# Altium footprint library DrPCB.PcbLib: 910 footprints (part 27 of 57)
Each footprint in its own frame and in the unit in brackets; x right, y up, seen from the top. Pads: shape width x height; smd on the part's side, far side on the other; paste and mask are expansions set on the pad; w line width, h text height; cw(c..) or ccw(c..) is an arc to the next point about the centre after c.
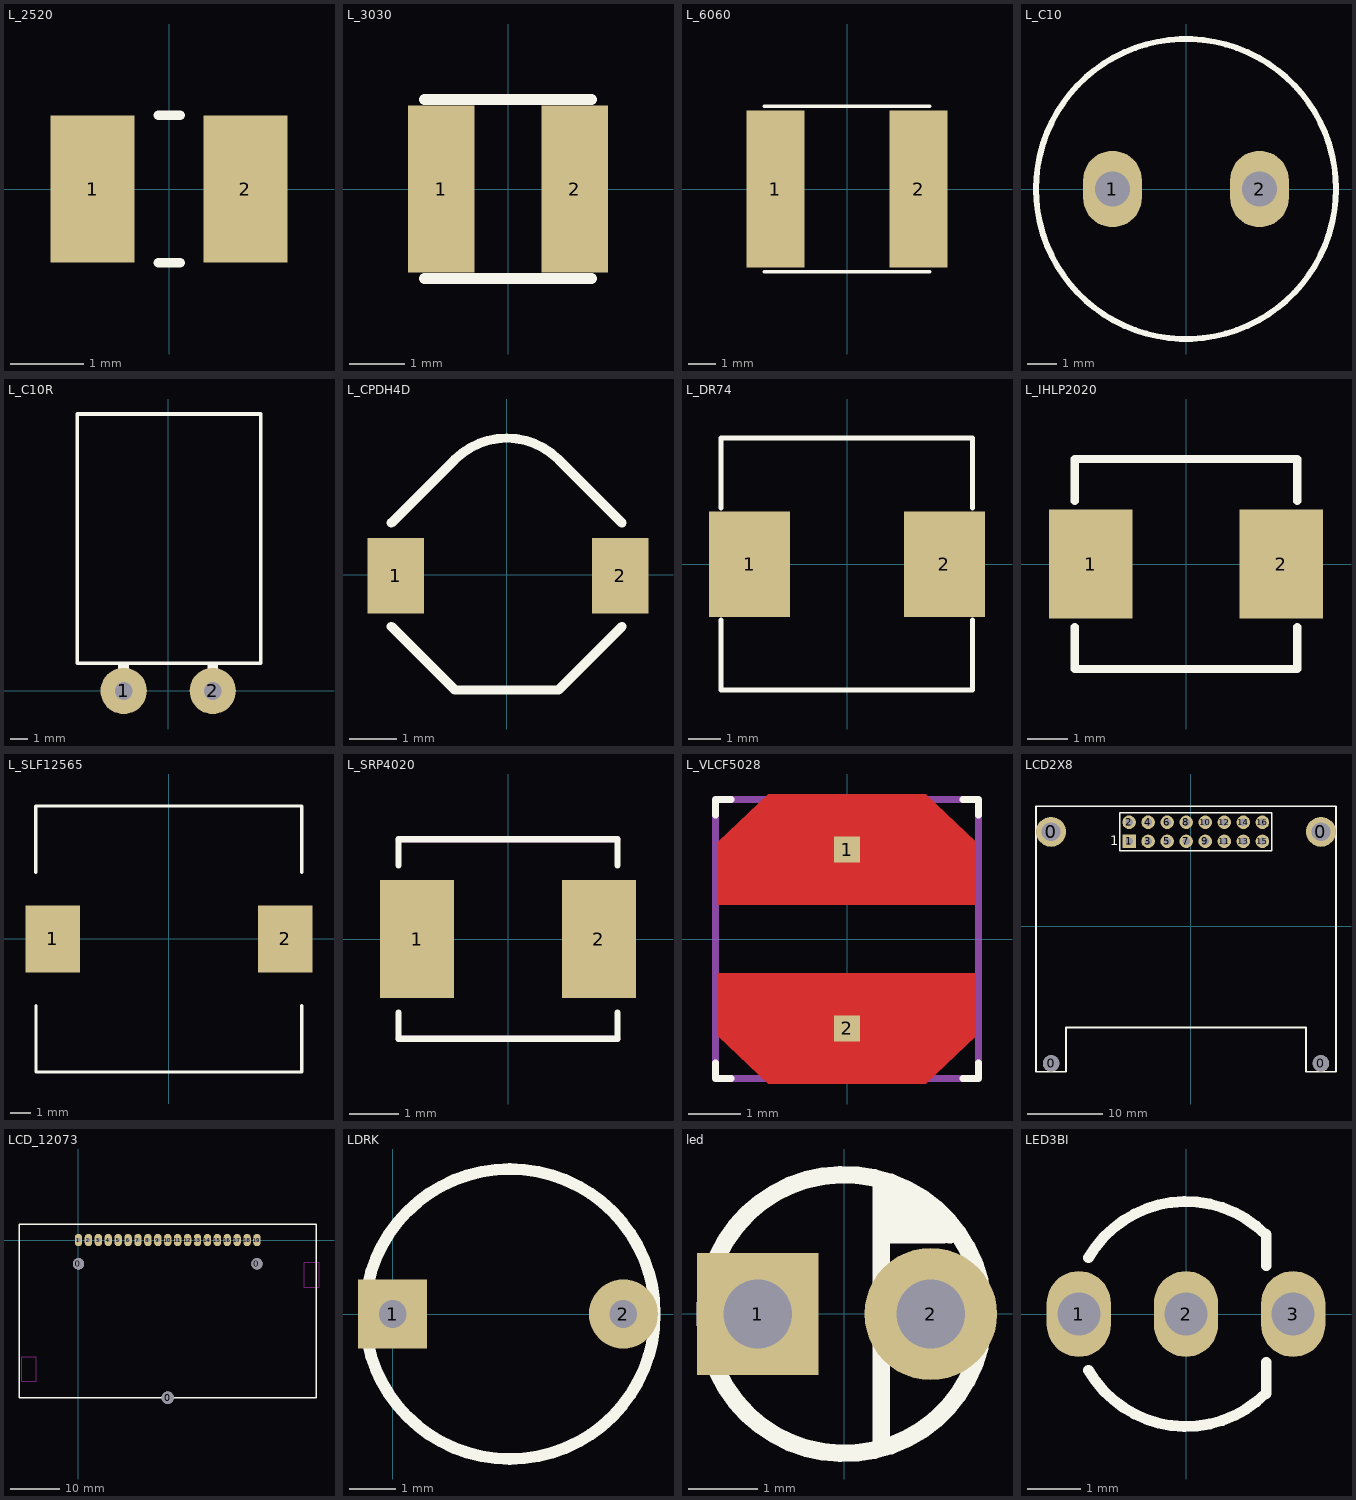
[diagram p26: the footprints below, top view; thin cyan lines are the x and y axes]

## L_2520 [mm]
pads (2):
  rect 1.14x2 smd: 1(-1.04,0) 2(1.04,0)
Top Overlay:
  lines w0.127: -0.148,-1.003 0.152,-1.003 ; -0.148,1.003 0.152,1.003
3D body "DFE252010F-2R2M=P2.STEP": height 1, standoff 0, extent -1.25,-1 1.25,1

## L_3030 [mm]
pads (2):
  rect 1.2x3 smd paste+0 mask+0: 1(-1.2,0) 2(1.2,0)
Top Overlay:
  lines w0.2: -1.501,-1.613 1.499,-1.613 ; -1.501,1.613 1.499,1.613
3D body "LQH3NPN100MG0L.STEP": height 1, standoff 0, extent -1.5,-1.5 1.5,1.5

## L_6060 [mm]
pads (2):
  rect 2.1x5.7 smd: 1(-2.6,0) 2(2.6,0)
Top Overlay:
  lines w0.127: -3,-3 3,-3 ; -3,3 3,3
3D body "1255AY-100M=P3.STEP": height 4.5, standoff 0, extent -3,-3 3,3

## L_C10 [mm] "INDUCTOR, Cylinder, 10mm,"
pads (2):
  oval 2x2.6 hole 1.2: 1(-2.5,0) 2(2.5,0)
Top Overlay:
  circle w0.2: c0,0 r5.1
3D body "User Library-Inductor 10x12 (200 mils).STEP": height 12.13, standoff -3.87, extent -5,-5 5,5

## L_C10R [mm] "INDUCTOR, Cylinder, 10mm,"
pads (2):
  round 2.6 hole 1: 1(-2.5,0) 2(2.5,0)
Top Overlay:
  rectangle: -2.805,1.143 -2.205,1.543
  region: 2.795,1.543 2.195,1.543 2.195,1.143 2.795,1.143
  lines w0.2: -5.105,1.543 5.195,1.543 5.195,15.543 -5.105,15.543 -5.105,1.543

## L_CPDH4D [mm]
pads (2):
  rect 1.2x1.6 smd paste+0 mask+0: 1(-2.348,-0.022) 2(2.402,-0.022)
Top Overlay:
  lines w0.2: -2.44,-1.096 -1.096,-2.44 1.096,-2.44 2.44,-1.096 ; -2.44,1.096 -1.096,2.44 cw(c0,1.344) 1.096,2.44 2.44,1.096
3D body: height 0.25, standoff 0, extent 0.027,-0.022 0.281,0.232
3D body "User Library-Sumida_CDPH4D19FNP-6R8MC.step": height 1.9, standoff -0.03, extent -3.465,-3.465 3.465,3.465

## L_DR74 [mm]
pads (2):
  rect 2.5x3.25 smd: 1(-3,0) 2(3,0)
Top Overlay:
  lines w0.15: -3.886,-1.725 -3.886,-3.873 3.873,-3.873 3.873,-1.725 ; -3.886,1.725 -3.886,3.886 3.873,3.886 3.873,1.725
3D body "DR74-2R2-R--3DModel-STEP-56544.STEP": height 4.35, standoff 0, extent -3.8,-3.8 3.8,3.8

## L_IHLP2020 [mm]
pads (2):
  rect 2.05x2.7 smd paste-0.3: 1(-2.35,0) 2(2.35,0)
Top Overlay:
  lines w0.2: -2.745,-1.549 -2.745,-2.59 2.745,-2.59 2.745,-1.549 ; -2.745,1.549 -2.745,2.59 2.745,2.59 2.745,1.549
3D body "ihlp2020bzer100m11.stp": height 1.93, standoff 0.01, extent -2.725,-2.573 2.725,2.573

## L_SLF12565 [mm]
pads (2):
  rect 2.6x3.2 smd: 1(-5.55,0) 2(5.55,0)
Top Overlay:
  lines w0.15: -6.35,3.175 -6.35,6.337 6.325,6.337 6.325,3.175 ; -6.337,-3.175 -6.337,-6.337 6.325,-6.337 6.325,-3.175
3D body "SLF12565T-100M4R8-H.STEP": height 6.85, standoff 0, extent -6.25,-6.25 6.25,6.25

## L_SRP4020 [mm]
pads (2):
  rect 1.5x2.4 smd: 1(-1.85,0) 2(1.85,0)
Top Overlay:
  lines w0.127: -2.225,-1.5 -2.225,-2.03 2.225,-2.03 2.225,-1.5 ; -2.225,1.5 -2.225,2.03 2.225,2.03 2.225,1.5
Mechanical 13:
  lines w0.127: -2.225,-2.03 2.225,-2.03 ; -2.225,2.03 2.225,2.03
3D body "SRP4020TA-R10Y.STEP": height 2, standoff 0, extent -2.225,-2.03 2.225,2.03

## L_VLCF5028 [mm]
height 2
pads (2):
  rect 0.5x0.5 smd paste-1 mask+0: 1(0,1.7) 2(0,-1.7)
Top Layer:
  region: 2.45,-1.85 1.5,-2.75 -1.5,-2.75 -2.45,-1.85 -2.45,-0.65 2.45,-0.65
  region: 2.45,1.85 2.45,0.65 -2.45,0.65 -2.45,1.85 -1.5,2.75 1.5,2.75
Top Overlay:
  lines w0.127: -2.5,-2.35 -2.5,-2.65 -2.2,-2.65 ; -2.5,2.35 -2.5,2.65 -2.2,2.65 ; 2.2,-2.65 2.5,-2.65 2.5,-2.35 ; 2.2,2.65 2.5,2.65 2.5,2.35
Top Paste:
  region: 2.45,-1.85 1.5,-2.75 -1.5,-2.75 -2.45,-1.85 -2.45,-0.65 2.45,-0.65
  region: 2.45,1.85 2.45,0.65 -2.45,0.65 -2.45,1.85 -1.5,2.75 1.5,2.75
Top Solder:
  region: 2.55,-1.95 1.6,-2.85 -1.6,-2.85 -2.55,-1.95 -2.55,-0.55 2.55,-0.55
  region: 2.55,1.95 2.55,0.55 -2.55,0.55 -2.55,1.95 -1.6,2.85 1.6,2.85
Mechanical 13:
  lines w0.127: -2.5,-2.65 2.5,-2.65 2.5,2.65 -2.5,2.65 -2.5,-2.65
3D body "VLCF5028T-1R3N2R5-2.STEP": height 2.8, standoff 0, extent -2.5,-2.5 2.5,2.5

## LCD2X8 [mm]
pads (20):
  round 2.2 hole 2.2: 0(-18.612,-18.275) 0(17.38,-18.275)
  round 4 hole 2.5: 0(-18.612,12.611) 0(17.38,12.611)
  rect 1.8x1.8 hole 1: 1(-8.211,11.341)
  round 1.8 hole 1: 2(-8.211,13.881) 3(-5.671,11.341) 4(-5.671,13.881) 5(-3.131,11.341) 6(-3.131,13.881) 7(-0.591,11.341) 8(-0.591,13.881) 9(1.949,11.341) 10(1.949,13.881) 11(4.489,11.341) 12(4.489,13.881) 13(7.029,11.341) 14(7.029,13.881) 15(9.569,11.341) 16(9.569,13.881)
Top Overlay:
  lines w0.2: -9.481,10.071 10.839,10.071 10.839,15.151 -9.481,15.151 -9.481,10.071
  lines w0.254: -20.618,-19.38 -16.618,-19.38 -16.618,-13.487 15.382,-13.487 15.382,-19.38 19.382,-19.38 19.382,16.015 -20.618,16.015 -20.618,-19.38
  text "1" at -10.751,10.833 h1.27

## LCD_12073 [mm]
pads (22):
  round 2.3 hole 2.3: 0(0,-4.8) 0(36,-4.8)
  round 2.5 hole 2.5: 0(18,-31.792)
  oval 1.5x2.5 hole 0.8: 1(0,0) 2(2,0) 3(4,0) 4(6,0) 5(8,0) 6(10,0) 7(12,0) 8(14,0) 9(16,0) 10(18,0) 11(20,0) 12(22,0) 13(24,0) 14(26,0) 15(28,0) 16(30,0) 17(32,0) 18(34,0) 19(36,0)
Top Overlay:
  lines w0.3: -12,-31.792 48,-31.792 48,3.208 -12,3.208 -12,-31.792
Keep-Out Layer:
  lines w0.1: -11.493,-28.466 -11.493,-23.5 -8.509,-23.5 -8.509,-28.466 -11.493,-28.466 ; 45.504,-9.5 45.504,-4.508 48.489,-4.508 48.514,-4.534 48.514,-9.5 45.504,-9.5

## LDRK [mm]
pads (2):
  rect 1.5x1.5 hole 0.6: 1(0,0)
  round 1.5 hole 0.6: 2(5,0)
Top Overlay:
  circle w0.254: c2.54,0 r3.142

## led [mm]
pads (2):
  rect 1.75x1.75 hole 0.99: 1(-1.247,-0.006)
  round 1.905 hole 0.991: 2(1.242,-0.006)
Top Overlay:
  circle w0.254: c-0.002,-0.006 r2.007
  lines w0.254: 0.531,-1.911 0.531,1.899 ; 0.531,1.137 1.42,1.137 1.293,1.264 ; 0.531,1.391 1.293,1.391 ; 0.531,1.645 1.039,1.645 1.293,1.391 ; 1.513,1.132 1.293,1.352 1.293,1.391

## LED3BI [mm] "LED THD 5MM BICOLOR"
pads (3):
  oval 1.2x1.6 hole 0.8: 1(-2,0) 2(0,0) 3(2,0)
Top Overlay:
  lines w0.2: -1.819,-1.05 ccw(c0,0) 1.485,-1.485 ; -1.819,1.05 cw(c0,0) 1.485,1.485 ; 1.5,-1.485 1.5,-0.9 ; 1.5,0.9 1.5,1.485
3D body "led3mmbi_WP3V.STEP": height 7.4, standoff -22.1, extent -2.35,-1.998 2.35,1.998